# Altium footprint library Integrated_Circuit.PcbLib: 85 footprints (part 4 of 6)
Each footprint in its own frame and in the unit in brackets; x right, y up, seen from the top. Pads: shape width x height; smd on the part's side, far side on the other; paste and mask are expansions set on the pad; w line width, h text height; cw(c..) or ccw(c..) is an arc to the next point about the centre after c.
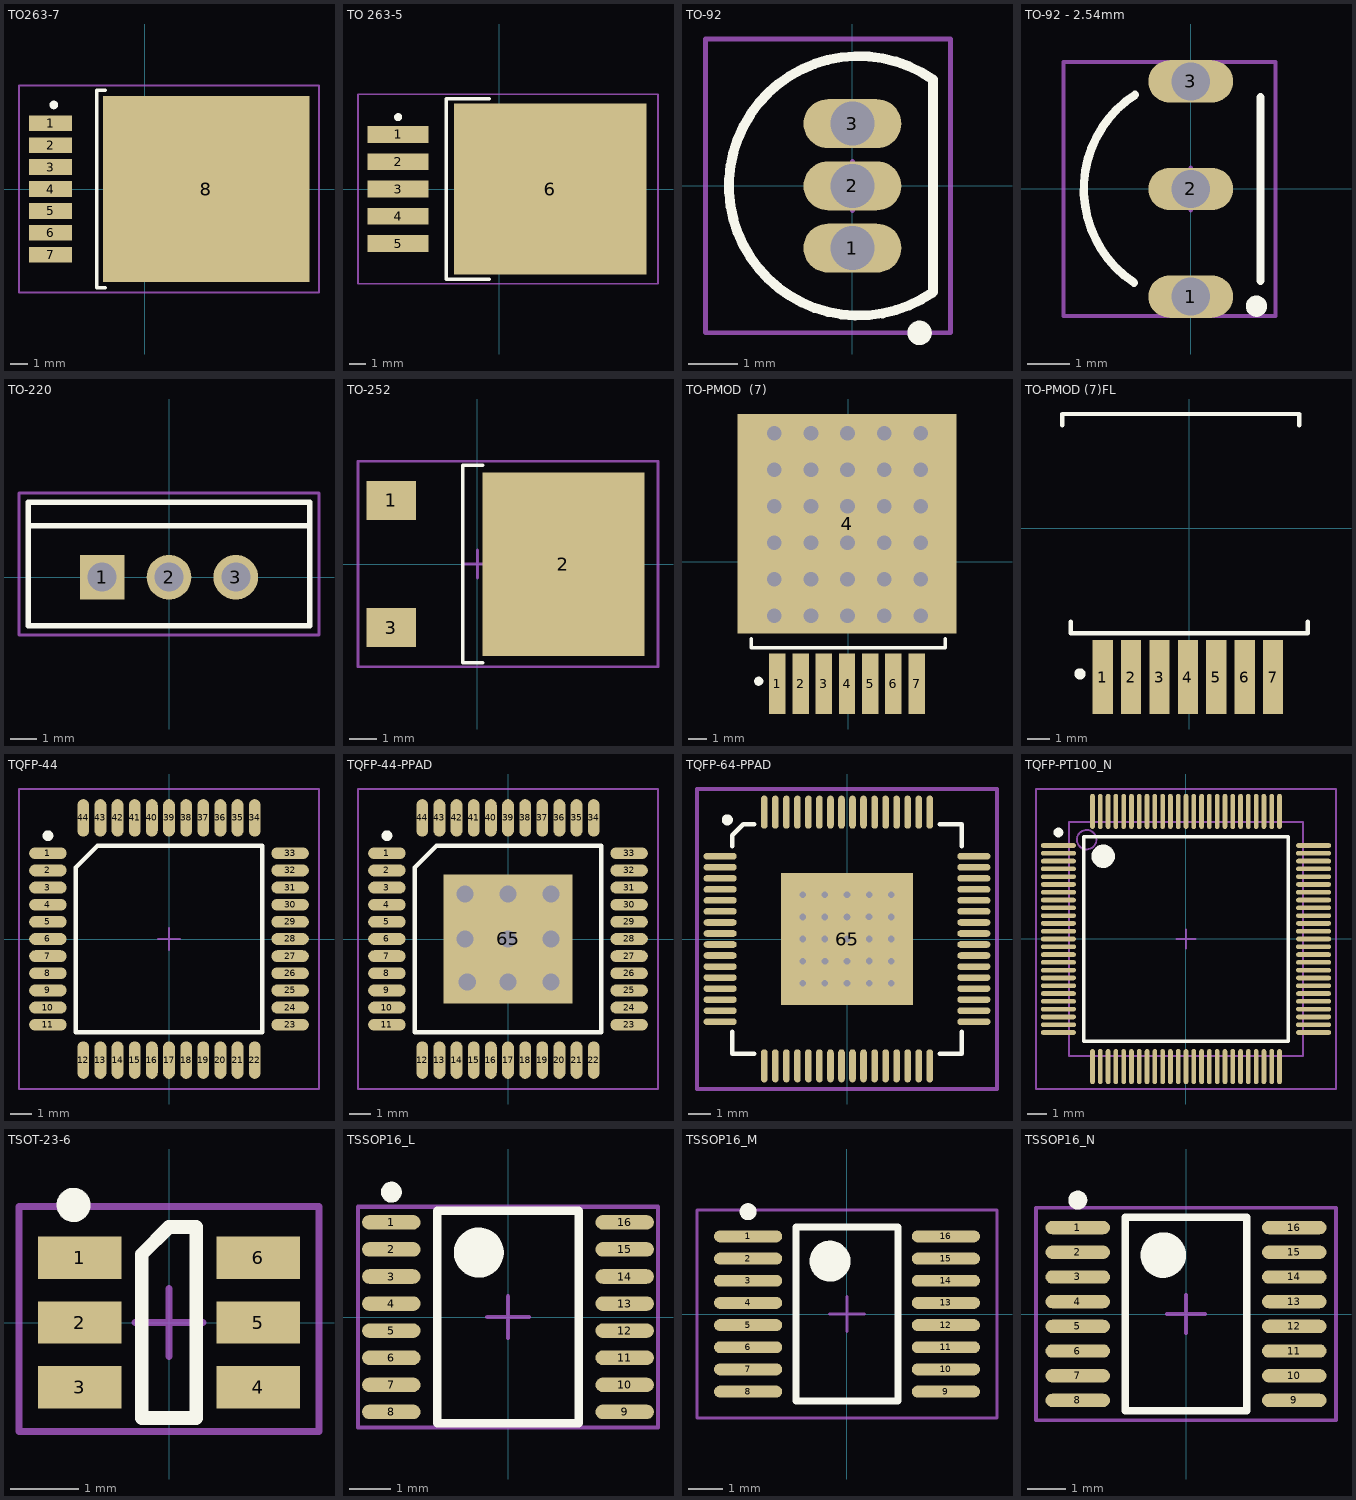
[diagram p3: the footprints below, top view; thin cyan lines are the x and y axes]

## TO263-7 [mm] "D2-PAK, 8-Leads, Body 8.9x10.1mm, Pitch 1.27mm, Lead Span 14.2mm, IPC High Density"
height 4.65
pads (8):
  rect 2.5x0.914 smd: 1(-5.471,3.81) 2(-5.471,2.54) 3(-5.471,1.27) 4(-5.471,0) 5(-5.471,-1.27) 6(-5.471,-2.54) 7(-5.471,-3.81)
  rect 12x10.795 smd: 8(3.562,0)
Top Overlay:
  circle w0.25: c-5.281,4.875 r0.125
  lines w0.2: -2.286,-5.719 -2.794,-5.719 -2.794,5.719 -2.286,5.719
Mechanical 15:
  lines w0.1: -0.5,0 0.5,0 ; 0,-0.5 0,0.5 ; -7.3,-6 -7.3,6 10.1,6 10.1,-6 -7.3,-6
3D body "SW3dPS-TO263-7.stp": height 4.64, standoff 0.06, extent -6.167,-5.08 8.199,5.08

## TO 263-5 [mm] "D2-PAK, 6-Leads, Body 9x10.2mm, Pitch 1.7mm, Lead Span 15.2mm, IPC Medium Density"
height 4.83
pads (6):
  rect 3.8x1.05 smd: 1(-6.3,3.4) 2(-6.3,1.7) 3(-6.3,0) 4(-6.3,-1.7) 5(-6.3,-3.4)
  rect 12x10.65 smd: 6(3.187,0)
Top Overlay:
  circle w0.25: c-6.3,4.475 r0.125
  lines w0.2: -0.6,-5.625 -3.3,-5.625 -3.3,5.625 -0.6,5.625
Mechanical 15:
  lines w0.1: -0.5,0 0.5,0 ; 0,-0.5 0,0.5 ; -8.8,-5.9 9.9,-5.9 9.9,5.9 -8.8,5.9 -8.8,-5.9
3D body "TO263-5.STEP": height 4.83, standoff 0.03, extent -7.403,-5 8.267,5

## TO-92 [mm]
pads (3):
  oval 2x1 hole 0.9: 1(0,-1.27) 2(0,0) 3(0,1.27)
Top Overlay:
  circle w0.25: c1.371,-3.003 r0.125
  lines w0.2: 1.647,-2.171 cw(c0.127,0) 1.647,2.171 1.647,-2.171
Mechanical 15:
  lines w0.1: -0.5,0 0.5,0 ; 0,-0.5 0,0.5 ; -3,-3 -3,3 2,3 2,-3 -3,-3
3D body "TO-92.STEP": height 5.55, standoff -3.15, extent -2.413,-2.397 1.587,2.397

## TO-92 - 2.54mm [mm]
pads (3):
  oval 2x1 hole 0.9: 1(0,-2.54) 2(0,0) 3(0,2.54)
Top Overlay:
  circle w0.25: c1.55,-2.765 r0.125
  lines w0.2: -1.339,-2.208 cw(c0.127,0) -1.315,2.223 ; 1.647,-2.171 1.647,2.171
Mechanical 15:
  lines w0.1: -0.5,0 0.5,0 ; 0,-0.5 0,0.5 ; -3,-3 -3,3 2,3 2,-3 -3,-3
3D body "User Library-TO92.SLDPRT": height 7.2, standoff -4.1, extent -2.55,-2.765 1.55,2.765

## TO-220 [mm] "TO, Thru-Hole, Vertical, Heatsink Mounted; 3 In-Line Leads; Pitch 2.54 mm"
height 22.9
pads (3):
  rect 1.7x1.7 hole 1.1: 1(-2.54,0)
  round 1.7 hole 1.1: 2(0,0) 3(2.54,0)
Top Overlay:
  lines w0.2: -5.35,1.95 5.35,1.95 ; -5.35,-1.85 -5.35,2.85 5.35,2.85 5.35,-1.85 -5.35,-1.85
Mechanical 15:
  lines w0.1: -0.5,0 0.5,0 ; 0,-0.5 0,0.5 ; -5.7,-2.2 -5.7,3.2 5.7,3.2 5.7,-2.2 -5.7,-2.2
3D body "User Library-TO220-A PCB.step": height 18.69, standoff -4.8, extent -4.95,-1.558 4.95,2.9

## TO-252 [mil] "TO-252-3, DPak (2 Leads + Tab), SC-63"
height 90.55
pads (3):
  rect 70x55 smd paste+0: 1(-121.95,90.2) 3(-121.95,-90.2)
  rect 230x260 smd paste+0: 2(121.95,-0.1)
Top Overlay:
  lines w5: 7.38,-140.26 -21.15,-140.26 -21.15,140.26 7.38,140.26
Mechanical 15:
  lines w3.94: -19.68,0 19.68,0 ; 0,-19.68 0,19.69 ; -169.29,-145.67 -169.29,145.67 255.91,145.67 255.91,-145.67 -169.29,-145.67
3D body "46ROI9496003 - TO252.stp": height 90.55, standoff -0.35, extent -150,-129.53 231.89,129.52

## TO-PMOD  (7) [mm]
pads (8):
  rect 0.9x3.3 smd: 1(-3.88,-6.667) 2(-2.61,-6.667) 3(-1.34,-6.667) 4(-0.07,-6.667) 5(1.2,-6.667) 6(2.47,-6.667) 7(3.74,-6.667)
  rect 12x12 smd: 4(-0.07,2.095)
via -2.042,7.047 diameter 1.5 hole 0.8
via -4.042,7.047 diameter 1.5 hole 0.8
via -0.042,7.047 diameter 1.5 hole 0.8
via 1.958,7.047 diameter 1.5 hole 0.8
via 3.958,7.047 diameter 1.5 hole 0.8
via -2.042,5.047 diameter 1.5 hole 0.8
via -4.042,5.047 diameter 1.5 hole 0.8
via -0.042,5.047 diameter 1.5 hole 0.8
via 1.958,5.047 diameter 1.5 hole 0.8
via 3.958,5.047 diameter 1.5 hole 0.8
via -2.042,3.047 diameter 1.5 hole 0.8
via -4.042,3.047 diameter 1.5 hole 0.8
via -0.042,3.047 diameter 1.5 hole 0.8
via 1.958,3.047 diameter 1.5 hole 0.8
via 3.958,3.047 diameter 1.5 hole 0.8
via -2.042,1.047 diameter 1.5 hole 0.8
via -4.042,1.047 diameter 1.5 hole 0.8
via -0.042,1.047 diameter 1.5 hole 0.8
via 1.958,1.047 diameter 1.5 hole 0.8
via 3.958,1.047 diameter 1.5 hole 0.8
via 3.958,-0.953 diameter 1.5 hole 0.8
via 1.958,-0.953 diameter 1.5 hole 0.8
via -0.042,-0.953 diameter 1.5 hole 0.8
via -4.042,-0.953 diameter 1.5 hole 0.8
via 3.958,-2.952 diameter 1.5 hole 0.8
via 1.958,-2.952 diameter 1.5 hole 0.8
via -0.042,-2.952 diameter 1.5 hole 0.8
via -2.042,-0.953 diameter 1.5 hole 0.8
via -2.042,-2.952 diameter 1.5 hole 0.8
via -4.042,-2.952 diameter 1.5 hole 0.8
Top Overlay:
  circle w0.25: c-4.9,-6.523 r0.125
  lines w0.2: -5.3,-4.2 -5.3,-4.7 5.3,-4.7 5.3,-4.2
3D body "User Library-TO-PMOD-7-1.STEP": height 4.57, standoff 0, extent -5.15,-7.898 5.01,5.878

## TO-PMOD (7)FL [mm]
pads (7):
  rect 0.9x3.3 smd: 1(-3.88,-6.667) 2(-2.61,-6.667) 3(-1.34,-6.667) 4(-0.07,-6.667) 5(1.2,-6.667) 6(2.47,-6.667) 7(3.74,-6.667)
Top Overlay:
  circle w0.25: c-4.9,-6.523 r0.125
  lines w0.2: -5.7,4.6 -5.7,5.1 4.9,5.1 4.9,4.6 ; -5.3,-4.2 -5.3,-4.7 5.3,-4.7 5.3,-4.2
3D body "User Library-TO-PMOD-7-1.STEP": height 4.57, standoff 0, extent -5.15,-7.898 5.01,5.878

## TQFP-44 [mm]
height 1
pads (44):
  oval 1.75x0.55 smd: 1(-5.65,4) 2(-5.65,3.2) 3(-5.65,2.4) 4(-5.65,1.6) 5(-5.65,0.8) 6(-5.65,0) 7(-5.65,-0.8) 8(-5.65,-1.6) 9(-5.65,-2.4) 10(-5.65,-3.2) 11(-5.65,-4) 23(5.65,-4) 24(5.65,-3.2) 25(5.65,-2.4) 26(5.65,-1.6) 27(5.65,-0.8) 28(5.65,0) 29(5.65,0.8) 30(5.65,1.6) 31(5.65,2.4) 32(5.65,3.2) 33(5.65,4)
  oval 0.55x1.75 smd: 12(-4,-5.65) 13(-3.2,-5.65) 14(-2.4,-5.65) 15(-1.6,-5.65) 16(-0.8,-5.65) 17(0,-5.65) 18(0.8,-5.65) 19(1.6,-5.65) 20(2.4,-5.65) 21(3.2,-5.65) 22(4,-5.65) 34(4,5.65) 35(3.2,5.65) 36(2.4,5.65) 37(1.6,5.65) 38(0.8,5.65) 39(0,5.65) 40(-0.8,5.65) 41(-1.6,5.65) 42(-2.4,5.65) 43(-3.2,5.65) 44(-4,5.65)
Top Overlay:
  circle w0.25: c-5.65,4.825 r0.125
  lines w0.2: -4.35,-4.35 -4.35,3.338 -3.337,4.35 4.35,4.35 4.35,-4.35 -4.35,-4.35
Mechanical 15:
  lines w0.1: -0.5,0 0.5,0 ; 0,-0.5 0,0.5 ; -7,-7 7,-7 7,7 -7,7 -7,-7
3D body "User Library-TQFP-44-1.STEP": height 1.1, standoff 0, extent -6,-6 6,6

## TQFP-44-PPAD [mm]
height 1
pads (45):
  oval 1.75x0.55 smd: 1(-5.65,4) 2(-5.65,3.2) 3(-5.65,2.4) 4(-5.65,1.6) 5(-5.65,0.8) 6(-5.65,0) 7(-5.65,-0.8) 8(-5.65,-1.6) 9(-5.65,-2.4) 10(-5.65,-3.2) 11(-5.65,-4) 23(5.65,-4) 24(5.65,-3.2) 25(5.65,-2.4) 26(5.65,-1.6) 27(5.65,-0.8) 28(5.65,0) 29(5.65,0.8) 30(5.65,1.6) 31(5.65,2.4) 32(5.65,3.2) 33(5.65,4)
  oval 0.55x1.75 smd: 12(-4,-5.65) 13(-3.2,-5.65) 14(-2.4,-5.65) 15(-1.6,-5.65) 16(-0.8,-5.65) 17(0,-5.65) 18(0.8,-5.65) 19(1.6,-5.65) 20(2.4,-5.65) 21(3.2,-5.65) 22(4,-5.65) 34(4,5.65) 35(3.2,5.65) 36(2.4,5.65) 37(1.6,5.65) 38(0.8,5.65) 39(0,5.65) 40(-0.8,5.65) 41(-1.6,5.65) 42(-2.4,5.65) 43(-3.2,5.65) 44(-4,5.65)
  rect 6x6 smd: 65(0,0)
via 2,0 diameter 1.27 hole 0.8
via 0,0 diameter 1.27 hole 0.8
via -2,0 diameter 1.27 hole 0.8
via 2,-2 diameter 1.27 hole 0.8
via 0,-2 diameter 1.27 hole 0.8
via -1.9,-2 diameter 1.27 hole 0.8
via -2,2.1 diameter 1.27 hole 0.8
via 0,2.1 diameter 1.27 hole 0.8
via 2,2.1 diameter 1.27 hole 0.8
Top Overlay:
  circle w0.25: c-5.65,4.825 r0.125
  lines w0.2: -4.35,-4.35 4.35,-4.35 4.35,4.35 -3.337,4.35 -4.35,3.338 -4.35,-4.35
Mechanical 15:
  lines w0.1: -0.5,0 0.5,0 ; 0,-0.5 0,0.5 ; -7,-7 -7,7 7,7 7,-7 -7,-7
3D body "User Library-TQFP-44-1.STEP": height 1.1, standoff 0, extent -6,-6 6,6

## TQFP-64-PPAD [mm]
height 1
pads (65):
  oval 1.5x0.3 smd: 1(-5.75,3.75) 2(-5.75,3.25) 3(-5.75,2.75) 4(-5.75,2.25) 5(-5.75,1.75) 6(-5.75,1.25) 7(-5.75,0.75) 8(-5.75,0.25) 9(-5.75,-0.25) 10(-5.75,-0.75) 11(-5.75,-1.25) 12(-5.75,-1.75) 13(-5.75,-2.25) 14(-5.75,-2.75) 15(-5.75,-3.25) 16(-5.75,-3.75) 33(5.75,-3.75) 34(5.75,-3.25) 35(5.75,-2.75) 36(5.75,-2.25) 37(5.75,-1.75) 38(5.75,-1.25) 39(5.75,-0.75) 40(5.75,-0.25) 41(5.75,0.25) 42(5.75,0.75) 43(5.75,1.25) 44(5.75,1.75) 45(5.75,2.25) 46(5.75,2.75) 47(5.75,3.25) 48(5.75,3.75)
  oval 0.3x1.5 smd: 17(-3.75,-5.75) 18(-3.25,-5.75) 19(-2.75,-5.75) 20(-2.25,-5.75) 21(-1.75,-5.75) 22(-1.25,-5.75) 23(-0.75,-5.75) 24(-0.25,-5.75) 25(0.25,-5.75) 26(0.75,-5.75) 27(1.25,-5.75) 28(1.75,-5.75) 29(2.25,-5.75) 30(2.75,-5.75) 31(3.25,-5.75) 32(3.75,-5.75) 49(3.75,5.75) 50(3.25,5.75) 51(2.75,5.75) 52(2.25,5.75) 53(1.75,5.75) 54(1.25,5.75) 55(0.75,5.75) 56(0.25,5.75) 57(-0.25,5.75) 58(-0.75,5.75) 59(-1.25,5.75) 60(-1.75,5.75) 61(-2.25,5.75) 62(-2.75,5.75) 63(-3.25,5.75) 64(-3.75,5.75)
  rect 6x6 smd: 65(0,0)
via 0,0 diameter 0.5 hole 0.3
via 1,0 diameter 0.5 hole 0.3
via 2,0 diameter 0.5 hole 0.3
via 0,-2 diameter 0.5 hole 0.3
via 0,-1 diameter 0.5 hole 0.3
via 0,2 diameter 0.5 hole 0.3
via 0,1 diameter 0.5 hole 0.3
via 2,1 diameter 0.5 hole 0.3
via 1,1 diameter 0.5 hole 0.3
via 2,2 diameter 0.5 hole 0.3
via 1,2 diameter 0.5 hole 0.3
via 2,-1 diameter 0.5 hole 0.3
via 1,-1 diameter 0.5 hole 0.3
via 2,-2 diameter 0.5 hole 0.3
via 1,-2 diameter 0.5 hole 0.3
via -2,-2 diameter 0.5 hole 0.3
via -1,-2 diameter 0.5 hole 0.3
via -2,-1 diameter 0.5 hole 0.3
via -1,-1 diameter 0.5 hole 0.3
via -2,0 diameter 0.5 hole 0.3
via -1,0 diameter 0.5 hole 0.3
via -2,1 diameter 0.5 hole 0.3
via -1,1 diameter 0.5 hole 0.3
via -2,2 diameter 0.5 hole 0.3
via -1,2 diameter 0.5 hole 0.3
Top Overlay:
  circle w0.25: c-5.425,5.4 r0.125
  lines w0.2: -5.2,-4.2 -5.2,-5.199 ; -5.2,4.2 -5.2,4.7 -4.7,5.2 -4.2,5.2 ; -4.2,-5.2 -5.2,-5.2 ; 4.2,-5.2 5.201,-5.2 5.2,-5.2 5.2,-4.2 ; 4.2,5.2 5.2,5.2 5.2,5.2 5.2,4.2 ; -5.2,-5.199 -5.2,-5.2
Mechanical 15:
  lines w0.2: -1,0 1,0 ; 0,-1 0,1 ; -6.8,-6.8 6.8,-6.8 6.8,6.8 -6.8,6.8 -6.8,-6.8
3D body "User Library-LQFP64_Grid_0_5.STEP": height 1.6, standoff 0, extent -6,-6 6,6

## TQFP-PT100_N [mm] "Thin QFP, 100-Leads, Body 12x12mm, Pitch 0.4mm, IPC Medium Density"
height 1.2
pads (100):
  oval 1.8x0.24 smd: 1(-6.55,4.8) 2(-6.55,4.4) 3(-6.55,4) 4(-6.55,3.6) 5(-6.55,3.2) 6(-6.55,2.8) 7(-6.55,2.4) 8(-6.55,2) 9(-6.55,1.6) 10(-6.55,1.2) 11(-6.55,0.8) 12(-6.55,0.4) 13(-6.55,0) 14(-6.55,-0.4) 15(-6.55,-0.8) 16(-6.55,-1.2) 17(-6.55,-1.6) 18(-6.55,-2) 19(-6.55,-2.4) 20(-6.55,-2.8) 21(-6.55,-3.2) 22(-6.55,-3.6) 23(-6.55,-4) 24(-6.55,-4.4) 25(-6.55,-4.8) 51(6.55,-4.8) 52(6.55,-4.4) 53(6.55,-4) 54(6.55,-3.6) 55(6.55,-3.2) 56(6.55,-2.8) 57(6.55,-2.4) 58(6.55,-2) 59(6.55,-1.6) 60(6.55,-1.2) 61(6.55,-0.8) 62(6.55,-0.4) 63(6.55,0) 64(6.55,0.4) 65(6.55,0.8) 66(6.55,1.2) 67(6.55,1.6) 68(6.55,2) 69(6.55,2.4) 70(6.55,2.8) 71(6.55,3.2) 72(6.55,3.6) 73(6.55,4) 74(6.55,4.4) 75(6.55,4.8)
  oval 0.24x1.8 smd: 26(-4.8,-6.55) 27(-4.4,-6.55) 28(-4,-6.55) 29(-3.6,-6.55) 30(-3.2,-6.55) 31(-2.8,-6.55) 32(-2.4,-6.55) 33(-2,-6.55) 34(-1.6,-6.55) 35(-1.2,-6.55) 36(-0.8,-6.55) 37(-0.4,-6.55) 38(0,-6.55) 39(0.4,-6.55) 40(0.8,-6.55) 41(1.2,-6.55) 42(1.6,-6.55) 43(2,-6.55) 44(2.4,-6.55) 45(2.8,-6.55) 46(3.2,-6.55) 47(3.6,-6.55) 48(4,-6.55) 49(4.4,-6.55) 50(4.8,-6.55) 76(4.8,6.55) 77(4.4,6.55) 78(4,6.55) 79(3.6,6.55) 80(3.2,6.55) 81(2.8,6.55) 82(2.4,6.55) 83(2,6.55) 84(1.6,6.55) 85(1.2,6.55) 86(0.8,6.55) 87(0.4,6.55) 88(0,6.55) 89(-0.4,6.55) 90(-0.8,6.55) 91(-1.2,6.55) 92(-1.6,6.55) 93(-2,6.55) 94(-2.4,6.55) 95(-2.8,6.55) 96(-3.2,6.55) 97(-3.6,6.55) 98(-4,6.55) 99(-4.4,6.55) 100(-4.8,6.55)
Top Overlay:
  circle w0.6: c-4.25,4.25 r0.3
  circle w0.25: c-6.55,5.47 r0.125
  lines w0.2: -5.25,-5.25 5.25,-5.25 5.25,5.25 -5.25,5.25 -5.25,-5.25
Mechanical 13:
  circle w0.1: c-5.1,5.1 r0.5
  lines w0.1: -6,-6 6,-6 6,6 -6,6 -6,-6
Mechanical 15:
  lines w0.1: -0.5,0 0.5,0 ; 0,-0.5 0,0.5 ; -7.7,-7.7 7.7,-7.7 7.7,7.7 -7.7,7.7 -7.7,-7.7
3D body: height 1.2, standoff 0, extent -6,-6 6,6

## TSOT-23-6 [mm]
height 1
pads (6):
  rect 1.22x0.62 smd: 1(-1.31,0.95) 2(-1.31,0) 3(-1.31,-0.95) 4(1.31,-0.95) 5(1.31,0) 6(1.31,0.95)
Top Overlay:
  circle w0.25: c-1.4,1.725 r0.125
  lines w0.2: -0.4,-1.4 0.4,-1.4 0.4,1.4 0,1.4 -0.4,1 -0.4,-1.4
Mechanical 15:
  lines w0.1: -0.5,0 0.5,0 ; 0,-0.5 0,0.5 ; -2.2,-1.6 2.2,-1.6 2.2,1.7 -2.2,1.7 -2.2,-1.6
3D body "User Library-TSOT-23-6(S6).STEP": height 1, standoff 0, extent -1.412,-1.45 1.412,1.45

## TSSOP16_L [mm] "TSOP, 16-Leads, Body 5x4.4mm, Pitch 0.65mm, IPC High Density"
height 1.1
pads (16):
  oval 1.4x0.35 smd: 1(-2.8,2.275) 2(-2.8,1.625) 3(-2.8,0.975) 4(-2.8,0.325) 5(-2.8,-0.325) 6(-2.8,-0.975) 7(-2.8,-1.625) 8(-2.8,-2.275) 9(2.8,-2.275) 10(2.8,-1.625) 11(2.8,-0.975) 12(2.8,-0.325) 13(2.8,0.325) 14(2.8,0.975) 15(2.8,1.625) 16(2.8,2.275)
Top Overlay:
  circle w0.6: c-0.7,1.55 r0.3
  circle w0.25: c-2.8,3 r0.125
  lines w0.2: -1.7,-2.55 1.7,-2.55 1.7,2.55 -1.7,2.55 -1.7,-2.55
Mechanical 15:
  lines w0.1: -0.5,0 0.5,0 ; 0,-0.5 0,0.5 ; -3.6,-2.65 3.6,-2.65 3.6,2.65 -3.6,2.65 -3.6,-2.65
3D body "User Library-AS3933-BTST.STEP": height 1.06, standoff -0.01, extent -3.25,-2.55 3.25,2.55

## TSSOP16_M [mm] "TSOP, 16-Leads, Body 5x4.4mm, Pitch 0.65mm, IPC Low Density"
height 1.1
pads (16):
  oval 2x0.35 smd: 1(-2.9,2.275) 2(-2.9,1.625) 3(-2.9,0.975) 4(-2.9,0.325) 5(-2.9,-0.325) 6(-2.9,-0.975) 7(-2.9,-1.625) 8(-2.9,-2.275) 9(2.9,-2.275) 10(2.9,-1.625) 11(2.9,-0.975) 12(2.9,-0.325) 13(2.9,0.325) 14(2.9,0.975) 15(2.9,1.625) 16(2.9,2.275)
Top Overlay:
  circle w0.25: c-2.9,3 r0.125
  circle w0.6: c-0.5,1.55 r0.3
  lines w0.2: -1.5,-2.55 -1.5,2.55 1.5,2.55 1.5,-2.55 -1.5,-2.55
Mechanical 15:
  lines w0.1: -0.5,0 0.5,0 ; 0,-0.5 0,0.5 ; -4.4,-3.05 -4.4,3.05 4.4,3.05 4.4,-3.05 -4.4,-3.05
3D body "User Library-AS3933-BTST.STEP": height 1.06, standoff -0.01, extent -3.25,-2.55 3.25,2.55

## TSSOP16_N [mm] "TSOP, 16-Leads, Body 5x4.4mm, Pitch 0.65mm, IPC Medium Density"
height 1.1
pads (16):
  oval 1.7x0.35 smd: 1(-2.85,2.275) 2(-2.85,1.625) 3(-2.85,0.975) 4(-2.85,0.325) 5(-2.85,-0.325) 6(-2.85,-0.975) 7(-2.85,-1.625) 8(-2.85,-2.275) 9(2.85,-2.275) 10(2.85,-1.625) 11(2.85,-0.975) 12(2.85,-0.325) 13(2.85,0.325) 14(2.85,0.975) 15(2.85,1.625) 16(2.85,2.275)
Top Overlay:
  circle w0.6: c-0.6,1.55 r0.3
  circle w0.25: c-2.85,3 r0.125
  lines w0.2: -1.6,-2.55 1.6,-2.55 1.6,2.55 -1.6,2.55 -1.6,-2.55
Mechanical 15:
  lines w0.1: -0.5,0 0.5,0 ; 0,-0.5 0,0.5 ; -3.95,-2.8 3.95,-2.8 3.95,2.8 -3.95,2.8 -3.95,-2.8
3D body "User Library-AS3933-BTST.STEP": height 1.06, standoff -0.01, extent -3.25,-2.55 3.25,2.55